# Altium footprint library laihi.PcbLib: 222 footprints (part 4 of 14)
Each footprint in its own frame and in the unit in brackets; x right, y up, seen from the top. Pads: shape width x height; smd on the part's side, far side on the other; paste and mask are expansions set on the pad; w line width, h text height; cw(c..) or ccw(c..) is an arc to the next point about the centre after c.
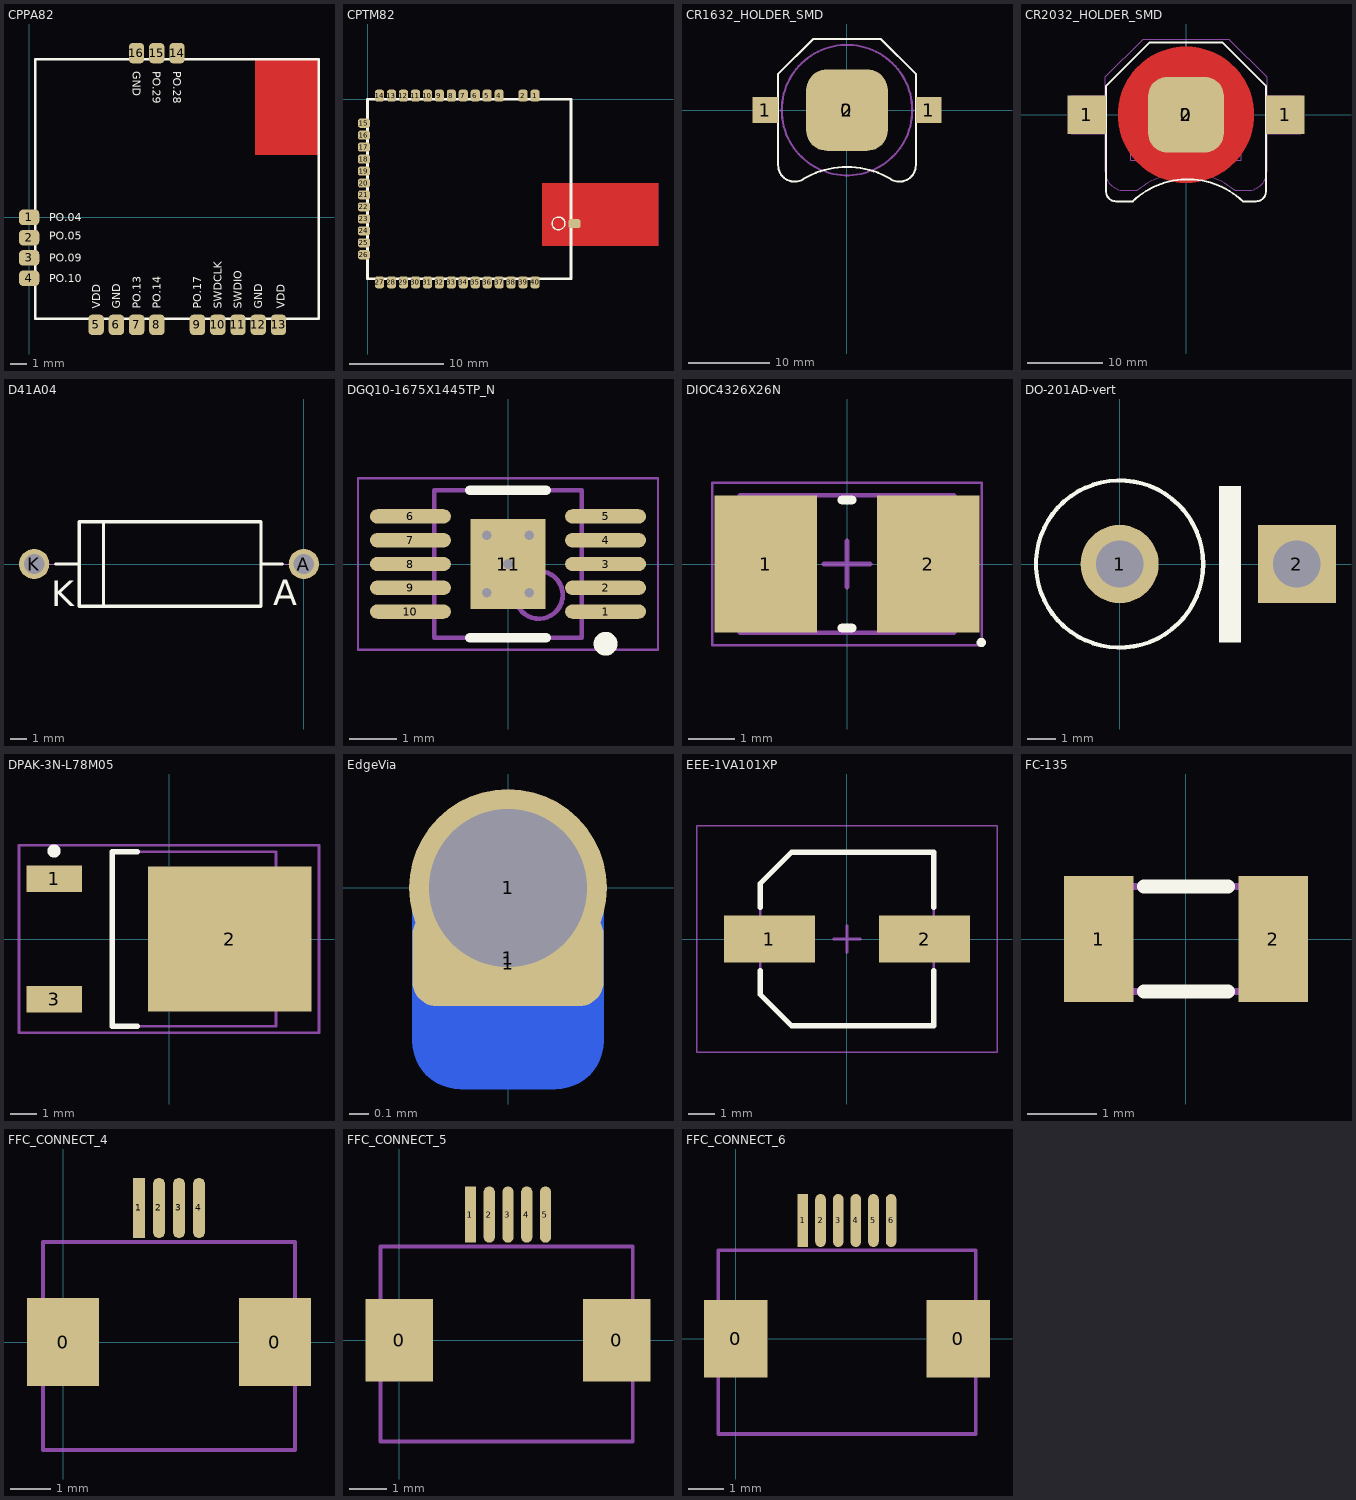
[diagram p3: the footprints below, top view; thin cyan lines are the x and y axes]

## CPPA82 [mil]
pads (16):
  rrect50% 50x38 smd mask+1: 1(0,0) 2(0,-50) 3(0,-100) 4(0,-150)
  rrect50% 38x50 smd mask+1: 5(165.18,-264.82) 6(215.18,-264.82) 7(265.18,-264.82) 8(315.18,-264.82) 9(415.18,-264.82) 10(465.18,-264.82) 11(515.18,-264.82) 12(565.18,-264.82) 13(615.18,-264.82) 14(364.82,404.94) 15(314.82,404.94) 16(264.82,404.94)
Top Layer:
  pour cut-out: 715,390.18 557.52,390.18 557.52,153.96 715,153.96
Bottom Layer:
  pour cut-out: 715,390.18 557.52,390.18 557.52,153.96 715,153.96
Top Overlay:
  lines w6: 15,-249.82 714.61,-249.82 714.61,389.94 15,389.94 15,-249.82
  text "PO.28" at 355,360.18 h20
  text "PO.29" at 305,360.18 h20
  text "GND" at 255,360.18 h20
  text "VDD" at 630,-224.8 h20
  text "GND" at 575,-224.8 h20
  text "SWDIO" at 525,-224.8 h20
  text "SWDCLK" at 475,-224.8 h20
  text "PO.17" at 425,-224.8 h20
  text "PO.14" at 325,-224.8 h20
  text "PO.13" at 275,-224.8 h20
  text "GND" at 225,-224.8 h20
  text "VDD" at 175,-224.8 h20
  text "PO.10" at 50,-159.82 h20
  text "PO.09" at 50,-109.82 h20
  text "PO.05" at 50,-54.82 h20
  text "PO.04" at 50,-9.82 h20

## CPTM82 [mil] "CLEPTRUM BLE module"
height 90.55
pads (40):
  rrect50% 38x50 smd mask+1: 1(700,15) 2(650,15) 4(550,15) 5(500,15) 6(450,15) 7(400,15) 8(350,15) 9(300,15) 10(250,15) 11(200,15) 12(150,15) 13(100,15) 14(50.02,15) 27(50.02,-765) 28(100.02,-765) 29(150.02,-765) 30(200.02,-765) 31(250.02,-765) 32(300.02,-765) 33(350.02,-765) 34(400.02,-765) 35(450.02,-765) 36(500.36,-765) 37(550.02,-765) 38(600,-765) 39(650,-765) 40(700,-765)
  rrect50% 50x38 smd mask+1: 15(-15,-100) 16(-15,-150) 17(-15,-200) 18(-15,-250) 19(-15,-300) 20(-15,-350) 21(-15,-400) 22(-15,-450) 23(-15,-500) 24(-15,-550) 25(-15,-600) 26(-15,-650) ANT(865,-520)
Top Layer:
  pour cut-out: 730,-613 1214,-613 1214,-350 730,-350
Bottom Layer:
  pour cut-out: 730,-613 1214,-613 1214,-350 730,-350
Top Overlay:
  circle w6: c798,-519 r26.93
  lines w12: 0,-750 850,-750 850,0 0,0 0,-750

## CR1632_HOLDER_SMD [mm] "CR1632 - SMD mount coin cell bat holder"
height 3
pads (4):
  round 13 on Top Solder: 0(0,0)
  rect 3.18x3.18 smd: 1(-10.02,0) 1(10.02,0)
  rrect50% 10x10 smd paste-9: 2(0,0)
Top Overlay:
  lines w0.254: -8.435,-6.765 ccw(c-6.435,-6.765) -5.435,-8.497 -5.27,-8.387 cw(c0,-17.516) 5.271,-8.387 5.435,-8.497 ccw(c6.435,-6.765) 8.435,-6.765 8.435,4.445 4.16,8.72 -4.16,8.72 -8.435,4.445 -8.435,-6.765
Mechanical 3:
  circle w0.254: c0,0 r8

## CR2032_HOLDER_SMD [mm] "CR2032 - SMD mount coin cell bat holder"
height 3
pads (4):
  round 18 on Top Solder paste+0: 0(0,0)
  rect 5.08x5.08 smd: 1(-13.081,0) 1(13.081,0)
  rrect50% 10x10 smd paste-9: 2(0,0)
Top Layer:
  circle w5: c0,0 r6.5
Top Overlay:
  lines w0.254: -7.027,-11.43 cw(c0.233,-19.072) 7.493,-11.43 9.271,-11.43 ccw(c9.271,-10.16) 10.541,-10.16 10.541,3.81 4.826,9.525 4.191,9.525 ; -6.985,-11.43 -9.271,-11.43 cw(c-9.271,-10.16) -10.541,-10.16 -10.541,3.81 -4.826,9.525 4.445,9.525
Mechanical 7:
  circle w0.1: c12.9,0 r1.25
  circle w0.1: c-12.9,0 r1.25
  lines w0.1: -10.65,-2.5 -15.15,-2.5 -15.15,2.5 -10.65,2.5 ; -7.3,-5.124 -4,-5.124 ; -7.3,-1.505 cw(c-5.65,1) -4,-1.505 ; -7.3,0.294 -4,0.294 ; -1.5,7.781 1.5,7.781 ; 0,6.281 0,9.281 ; 4,-5.124 7.3,-5.124 ; 4,-1.505 cw(c5.65,1) 7.3,-1.505 ; 4,0.294 7.3,0.294 ; 10.65,-2.5 15.15,-2.5 15.15,2.5 10.65,2.5 ; -10.65,-7.5 ccw(c-8.15,-7.5) -8.15,-10 -6.425,-10 cw(c0,-17.663) 6.425,-10 8.15,-10 ccw(c8.15,-7.5) 10.65,-7.5 10.65,5 5.65,10 -5.65,10 -10.65,5 -10.65,-7.5 ; -7.3,-6 -4,-6 -4,1 ccw(c-5.65,1) -7.3,1 -7.3,-6 ; 4,-6 7.3,-6 7.3,1 ccw(c5.65,1) 4,1 4,-6
  text ".Designator" at 0.825,0.125 h0.38
3D body "User Library-CR2032-3002.step": height 3.96, standoff 0, extent -15.367,-9.779 15.367,10.274

## D41A04 [mm] "Zener diode"
height 5.5
pads (2):
  round 1.8 hole 1.2: A(0,0) K(-16,0)
Top Overlay:
  lines w0.203: -14.732,0 -13.462,0 ; -11.885,-2.5 -11.885,2.5 ; -2.54,0 -1.27,0 ; -13.335,-2.5 -2.54,-2.5 -2.54,2.5 -13.335,2.5 -13.335,-2.5
  text "K" at -15,-2.5 h1.52
  text "A" at -1.8,-2.45 h1.52
Mechanical 13:
  circle w0.025: c-16,0 r0.508
  circle w0.025: c0,0 r0.508
  lines w0.025: -16,0 -13.335,0 ; -2.54,0 0,0 ; -13.335,-2.5 -2.54,-2.5 -2.54,2.5 -13.335,2.5 -13.335,-2.5
3D body: height 6.3, standoff 1, extent -13.35,-2.5 -2.55,2.45

## DGQ10-1675X1445TP_N [mm] "TSSOP, 10-Leads, Body 3x3mm, Pitch 0.5mm, Thermal Pad 1.88x1.57mm, IPC Medium Density"
height 1.1
pads (11):
  oval 1.7x0.3 smd: 1(2.05,-1) 2(2.05,-0.5) 3(2.05,0) 4(2.05,0.5) 5(2.05,1) 6(-2.05,1) 7(-2.05,0.5) 8(-2.05,0) 9(-2.05,-0.5) 10(-2.05,-1)
  rect 1.57x1.88 smd: 11(0,0)
via 0,0 diameter 0.5 hole 0.2
via 0.45,-0.6 diameter 0.5 hole 0.2
via -0.45,-0.6 diameter 0.5 hole 0.2
via -0.45,0.6 diameter 0.5 hole 0.2
via 0.45,0.6 diameter 0.5 hole 0.2
Top Overlay:
  circle w0.25: c2.05,-1.675 r0.125
  lines w0.2: -0.8,-1.55 0.8,-1.55 ; -0.8,1.55 0.8,1.55
Mechanical 13:
  circle w0.1: c0.65,-0.65 r0.5
  lines w0.1: -1.55,-1.55 -1.55,1.55 1.55,1.55 1.55,-1.55 -1.55,-1.55
Mechanical 15:
  lines w0.05: -3.15,-1.8 -3.15,1.8 3.15,1.8 3.15,-1.8 -3.15,-1.8
  lines w0.1: -0.5,0 0.5,0 ; 0,-0.5 0,0.5
3D body: height 1.1, standoff 0.05, extent -1.55,-1.55 1.55,1.55

## DIOC4326X26N [mm] "Chip Diode, 2-Leads, Body 4.30x2.63mm, IPC Medium Density"
height 2.62
pads (2):
  rect 2.2x2.95 smd: 1(-1.75,0) 2(1.75,0)
Top Overlay:
  circle w0.1: c2.887,-1.687 r0.05
  lines w0.2: -0.1,-1.375 0.1,-1.375 ; -0.1,1.375 0.1,1.375
Mechanical 13:
  lines w0.1: -2.3,-1.475 2.3,-1.475 2.3,1.475 -2.3,1.475 -2.3,-1.475
Mechanical 15:
  lines w0.05: -2.9,-1.75 2.9,-1.75 2.9,1.75 -2.9,1.75 -2.9,-1.75
  lines w0.1: -0.5,0 0.5,0 ; 0,-0.5 0,0.5
3D body: height 2.62, standoff 0, extent 1.16,-1.475 2.3,1.475
3D body: height 2.62, standoff 0, extent -2.3,-1.475 -1.16,1.475
3D body: height 2.62, standoff 0, extent -1.16,-1.475 1.16,1.475

## DO-201AD-vert [mm] "Diode, Axial; Body 9.5 x 5.6 mm (LxDia. max), Lead Dia. 1.32 mm (max)"
height 19
pads (2):
  round 2.8 hole 1.7: 1(0,0)
  rect 2.8x2.8 hole 1.7: 2(6.35,0)
Top Overlay:
  circle w0.152: c0,0 r2.994
  rectangle: 3.556,-2.806 4.356,2.794

## DPAK-3N-L78M05 [mm] "D-PAK, 3-Pads, Body 6.2x6.6mm (max), IPC Medium Density"
height 2.4
pads (3):
  rect 2.1x1 smd: 1(-4.35,2.28) 3(-4.35,-2.28)
  rect 6.2x5.5 smd: 2(2.3,0)
Top Overlay:
  circle w0.25: c-4.35,3.33 r0.125
  lines w0.2: -1.2,-3.3 -2.15,-3.3 -2.15,3.3 -1.2,3.3
Mechanical 13:
  lines w0.1: -2.15,-3.3 4.05,-3.3 4.05,3.3 -2.15,3.3 -2.15,-3.3
Mechanical 15:
  lines w0.1: -0.5,0 0.5,0 ; 0,-0.5 0,0.5 ; -5.675,-3.55 5.675,-3.55 5.675,3.55 -5.675,3.55 -5.675,-3.55
3D body: height 2.4, standoff 1.1, extent -2.15,-3.3 4.05,3.3

## EdgeVia [mil] "Edge Vias"
pads (3):
  rrect50% 38x50 smd far side mask+1: 1(0,-15)
  rrect50% 38x19 smd mask+1: 1(0,-14)
  round 39.37 hole 31.5 mask+3: 1(0,0)

## EEE-1VA101XP [mm] "Aluminum Electrolytic Capacitor, Body 6.60x6.60x7.70mm, IPC Low Density"
height 7.7
pads (2):
  rect 3.45x1.8 smd: 1(-2.95,0) 2(2.95,0)
Top Overlay:
  lines w0.2: -3.3,-1.2 -3.3,-2.1 -2.1,-3.3 3.3,-3.3 3.3,-1.2 ; -3.3,1.2 -3.3,2.1 -2.1,3.3 3.3,3.3 3.3,1.2
Mechanical 13:
  lines w0.1: -3.3,-2.1 -2.1,-3.3 3.3,-3.3 3.3,3.3 -2.1,3.3 -3.3,2.1 -3.3,-2.1
Mechanical 15:
  lines w0.05: -5.7,-4.3 -5.7,4.3 5.7,4.3 5.7,-4.3 -5.7,-4.3
  lines w0.1: -0.5,0 0.5,0 ; 0,-0.5 0,0.5
3D body: height 2.57, standoff 0, extent -3.3,-3.3 3.3,3.3
3D body: height 7.7, standoff 0, extent -3.15,-3.15 3.15,3.148

## Empty [mm] "Empty"

## FC-135 [mm]
pads (2):
  rect 1x1.8 smd: 1(-1.25,0) 2(1.25,0)
Top Overlay:
  lines w0.2: -0.6,-0.75 0.6,-0.75 ; -0.6,0.75 0.6,0.75
Mechanical 3:
  lines w0.1: -1.6,-0.55 cw(c-1.6,-0.75) -1.4,-0.75 1.4,-0.75 cw(c1.6,-0.75) 1.6,-0.55 1.6,0.55 cw(c1.6,0.75) 1.4,0.75 -1.4,0.75 cw(c-1.6,0.75) -1.6,0.55 -1.6,-0.55
3D body: height 0.81, standoff 0.15, extent -1.2,-0.6 1.2,0.6
3D body "User Library-Siward_SX3215.step": height 0.81, standoff 0, extent -1.6,-0.75 1.6,0.75

## FFC_CONNECT_4 [mm]
pads (6):
  rect 1.8x2.2 smd: 0(0,0) 0(5.3,0)
  rect 0.3x1.5 smd: 1(1.9,3.35)
  oval 0.3x1.5 smd: 2(2.4,3.35) 3(2.9,3.35) 4(3.4,3.35)
Mechanical 13:
  lines w0.1: -0.5,-2.7 5.8,-2.7 5.8,2.5 -0.5,2.5 -0.5,-2.7

## FFC_CONNECT_5 [mm]
pads (7):
  rect 1.8x2.2 smd: 0(0,0) 0(5.8,0)
  rect 0.3x1.5 smd: 1(1.9,3.35)
  oval 0.3x1.5 smd: 2(2.4,3.35) 3(2.9,3.35) 4(3.4,3.35) 5(3.9,3.35)
Mechanical 13:
  lines w0.1: -0.5,-2.7 -0.5,2.5 6.225,2.5 6.225,-2.7 -0.5,-2.7

## FFC_CONNECT_6 [mm]
pads (8):
  rect 1.8x2.2 smd: 0(0,0) 0(6.3,0)
  rect 0.3x1.5 smd: 1(1.9,3.35)
  oval 0.3x1.5 smd: 2(2.4,3.35) 3(2.9,3.35) 4(3.4,3.35) 5(3.9,3.35) 6(4.4,3.35)
Mechanical 13:
  lines w0.1: -0.5,-2.7 -0.5,2.5 6.8,2.5 6.8,-2.7 -0.5,-2.7